# Altium footprint library XTIDA-010086.PcbLib: 88 footprints (part 6 of 6)
Each footprint in its own frame and in the unit in brackets; x right, y up, seen from the top. Pads: shape width x height; smd on the part's side, far side on the other; paste and mask are expansions set on the pad; w line width, h text height; cw(c..) or ccw(c..) is an arc to the next point about the centre after c.
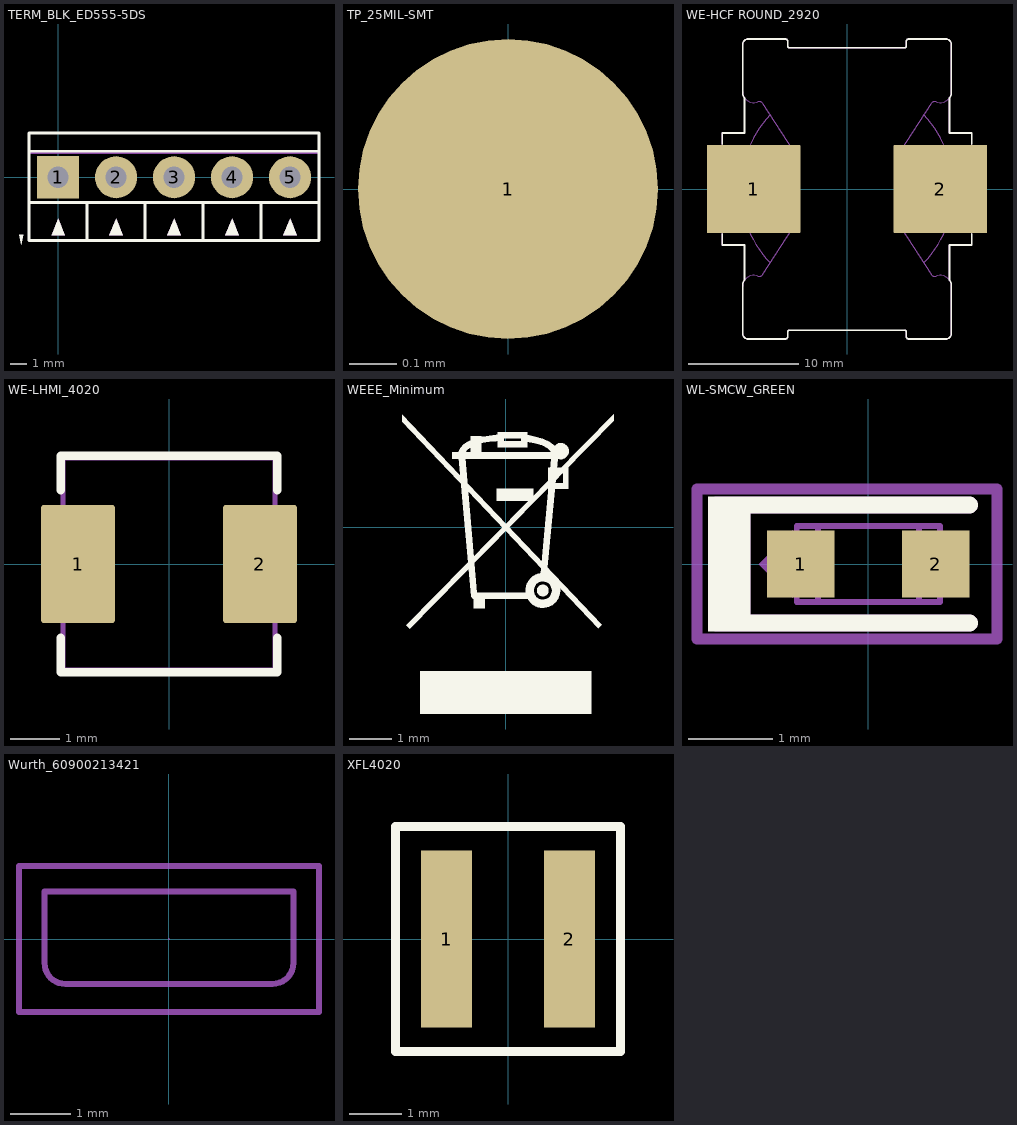
[diagram p5: the footprints below, top view; thin cyan lines are the x and y axes]

## TERM_BLK_ED555-5DS [mm]
height 0.6
pads (5):
  rect 2.54x2.54 hole 1.27: 1(0,0)
  round 2.54 hole 1.27: 2(3.5,0) 3(7,0) 4(10.5,0) 5(14,0)
Top Overlay:
  region: 0.4,-3.5 -0.4,-3.5 0,-2.5
  region: -2.235,-4.089 -2.108,-3.48 -2.362,-3.48
  region: 3.9,-3.5 3.1,-3.5 3.5,-2.5
  region: 10.9,-3.5 10.1,-3.5 10.5,-2.5
  region: 7.4,-3.5 6.6,-3.5 7,-2.5
  region: 14.4,-3.5 13.6,-3.5 14,-2.5
  lines w0.178: -1.752,1.572 1.748,1.572 5.248,1.572 8.748,1.572 12.248,1.572 15.748,1.572 ; 1.75,-3.815 1.75,-1.528 ; 5.25,-3.815 5.25,-1.528 ; 5.25,-3.81 -1.75,-3.81 -1.75,2.667 5.25,2.667 ; 8.75,-3.81 15.75,-3.81 ; 8.75,2.667 15.75,2.667 ; 12.25,-3.815 12.25,-1.528 ; 15.748,-3.828 12.248,-3.828 8.748,-3.828 ; 15.748,-1.528 12.248,-1.528 8.748,-1.528 ; 15.748,2.672 12.248,2.672 8.748,2.672 5.248,2.672 1.748,2.672 -1.752,2.672 -1.752,1.472 -1.752,-1.528 ; 15.75,-3.815 15.75,-1.528 15.75,1.472 15.75,2.672 ; -1.752,-1.528 1.748,-1.528 5.248,-1.528 8.748,-1.528 ; -1.752,-1.528 -1.752,-3.828 1.748,-3.828 5.248,-3.828 8.748,-3.828 ; 8.748,-3.828 8.748,-1.528 ; 8.748,-3.828 8.748,-1.528
Mechanical 5:
  region: 0.4,-3.5 -0.4,-3.5 0,-2.5
  region: 3.9,-3.5 3.1,-3.5 3.5,-2.5
  region: 7.4,-3.5 6.6,-3.5 7,-2.5
  region: 10.9,-3.5 10.1,-3.5 10.5,-2.5
  region: 14.4,-3.5 13.6,-3.5 14,-2.5
  lines w0.127: 1.75,-3.815 1.75,-1.528 ; 5.25,-3.815 5.25,-1.528 ; 5.25,-3.81 -1.75,-3.81 -1.75,2.667 5.25,2.667 ; 8.75,-3.81 15.75,-3.81 ; 8.75,2.667 15.75,2.667 ; 12.25,-3.815 12.25,-1.528 ; 15.748,-3.828 12.248,-3.828 8.748,-3.828 ; 15.748,-1.528 12.248,-1.528 8.748,-1.528 ; 15.748,1.472 12.248,1.472 8.748,1.472 5.248,1.472 1.748,1.472 -1.752,1.472 ; 15.748,2.672 12.248,2.672 8.748,2.672 5.248,2.672 1.748,2.672 -1.752,2.672 -1.752,1.472 ; 15.75,-3.815 15.75,-1.528 15.75,1.472 15.75,2.672 ; -1.752,-1.528 -1.752,1.472 ; -1.752,-1.528 1.748,-1.528 5.248,-1.528 8.748,-1.528 ; -1.752,-1.528 -1.752,-3.828 1.748,-3.828 5.248,-3.828 8.748,-3.828 ; 8.748,-3.828 8.748,-1.528
  text ".Designator" at 2,1.139 h1
3D body "On-Shore_ED555_5DS.stp": height 8.2, standoff -3.5, extent -1.745,-3.8 15.755,2.7

## TP_25MIL-SMT [mm]
height 1.75
pads (1):
  round 0.635 smd mask-0.064: 1(0,0)

## WE-HCF ROUND_2920 [mm] "SMT High Current Inductor, 2-Leads, body 28x25mm"
height 20.5
pads (2):
  rrect1% 8.5x8 smd: 1(-8.5,0) 2(8.5,0)
Top Overlay:
  lines w0.101: -9.5,8.719 ccw(c-8.903,8.719) -9.325,8.297
  lines w0.152: -11.35,-5.1 -10.35,-5.1 ; -11.35,-5.1 -11.35,-4.1 ; -11.35,-5.1 -11.35,-4.1 ; -11.35,-5.1 -10.35,-5.1 ; -11.35,-5.1 -11.35,-4.1 ; -11.35,-5.1 -10.35,-5.1 ; -11.35,4.1 -11.35,5.1 ; -11.35,4.1 -11.35,5.1 ; -11.35,4.1 -11.35,5.1 ; -11.35,5.1 -10.35,5.1 ; -11.35,5.1 -10.35,5.1 ; -11.35,5.1 -10.35,5.1 ; -10.35,-5.1 -9.325,-5.1 ; -10.35,5.1 -9.325,5.1 ; -9.325,-8.297 ccw(c-8.903,-8.719) -9.5,-8.719 -9.5,-8.868 -9.5,-13.15 ccw(c-9,-13.15) -9,-13.65 -5.6,-13.65 ccw(c-5.6,-13.45) -5.4,-13.45 -5.4,-13 cw(c-5.25,-13) -5.25,-12.85 0,-12.85 5.25,-12.85 cw(c5.25,-13) 5.4,-13 5.4,-13.45 ccw(c5.6,-13.45) 5.6,-13.65 9,-13.65 ccw(c9,-13.15) 9.5,-13.15 9.5,-8.868 9.5,-8.719 ccw(c8.903,-8.719) 9.325,-8.297 ; -9.325,-8.297 -9.325,-7.6 ; -9.325,-8.297 -9.325,-7.6 ; -9.325,-8.297 -9.325,-7.6 ; -9.325,-7.6 -9.325,-5.1 ; -9.325,-7.6 -9.325,-5.1 ; -9.325,-7.6 -9.325,-5.1 ; -9.325,5.1 -9.325,7.6 ; -9.325,5.1 -9.325,7.6 ; -9.325,5.1 -9.325,7.6 ; -9.325,7.6 -9.325,8.297 ; -9.325,7.6 -9.325,8.297 ; -9.325,7.6 -9.325,8.297 ; -9.325,8.297 cw(c-8.903,8.719) -9.5,8.719 -9.5,8.868 -9.5,13.15 cw(c-9,13.15) -9,13.65 -5.6,13.65 cw(c-5.6,13.45) -5.4,13.45 -5.4,13 ccw(c-5.25,13) -5.25,12.85 0,12.85 5.25,12.85 ccw(c5.25,13) 5.4,13 5.4,13.45 cw(c5.6,13.45) 5.6,13.65 9,13.65 cw(c9,13.15) 9.5,13.15 9.5,8.868 9.5,8.719 cw(c8.903,8.719) 9.325,8.297 ; 9.325,-8.297 9.325,-7.6 ; 9.325,-8.297 9.325,-7.6 ; 9.325,-8.297 9.325,-7.6 ; 9.325,-7.6 9.325,-5.1 ; 9.325,-7.6 9.325,-5.1 ; 9.325,-7.6 9.325,-5.1 ; 9.325,-5.1 10.35,-5.1 ; 9.325,5.1 9.325,7.6 ; 9.325,5.1 10.35,5.1 ; 9.325,5.1 9.325,7.6 ; 9.325,5.1 9.325,7.6 ; 9.325,7.6 9.325,8.297 ; 9.325,7.6 9.325,8.297 ; 9.325,7.6 9.325,8.297 ; 10.35,-5.1 11.35,-5.1 ; 10.35,-5.1 11.35,-5.1 ; 10.35,-5.1 11.35,-5.1 ; 10.35,5.1 11.35,5.1 ; 10.35,5.1 11.35,5.1 ; 10.35,5.1 11.35,5.1 ; 11.35,-5.1 11.35,-4.1 ; 11.35,-5.1 11.35,-4.1 ; 11.35,-5.1 11.35,-4.1 ; 11.35,4.1 11.35,5.1 ; 11.35,4.1 11.35,5.1 ; 11.35,4.1 11.35,5.1
Mechanical 5:
  lines w0.1: -6.984,-6.731 cw(c0,0) -6.97,6.746 ; 6.97,6.746 cw(c0,0) 6.984,-6.731 ; -11.548,-3 -11.548,0 ; -11.548,-3 -11.35,-3 ; -11.548,-3 -11.548,0 ; -11.548,-3 -11.35,-3 ; -11.548,-3 -11.35,-3 ; -11.548,-3 -11.548,0 ; -11.548,0 -11.548,3 ; -11.548,0 -11.548,3 ; -11.548,0 -11.548,3 ; -11.548,3 -11.35,3 ; -11.548,3 -11.35,3 ; -11.548,3 -11.35,3 ; -11.35,-5.1 -10.35,-5.1 ; -11.35,-5.1 -11.35,-4.1 ; -11.35,-5.1 -10.35,-5.1 ; -11.35,-5.1 -11.35,-4.1 ; -11.35,-5.1 -11.35,-4.1 ; -11.35,-5.1 -10.35,-5.1 ; -11.35,-4.1 -11.35,-2.686 -11.35,0 -11.35,2.686 -11.35,4.1 ; -11.35,4.1 -11.35,5.1 ; -11.35,4.1 -11.35,5.1 ; -11.35,4.1 -11.35,5.1 ; -11.35,5.1 -10.35,5.1 ; -11.35,5.1 -10.35,5.1 ; -11.35,5.1 -10.35,5.1 ; -10.35,-5.1 -9.325,-5.1 ; -10.35,5.1 -9.325,5.1 ; -9.325,-8.297 -9.325,-7.6 ; -9.325,-8.297 -9.325,-7.6 ; -9.325,-8.297 -9.325,-7.6 ; -9.325,-7.6 -9.325,-5.1 ; -9.325,-7.6 -9.325,-5.1 ; -9.325,-7.6 -9.325,-5.1 ; -9.325,5.1 -9.325,7.6 ; -9.325,5.1 -9.325,7.6 ; -9.325,5.1 -9.325,7.6 ; -9.325,7.6 -9.325,8.297 ; -9.325,7.6 -9.325,8.297 ; -9.325,7.6 -9.325,8.297 ; 9.325,-8.297 9.325,-7.6 ; 9.325,-8.297 9.325,-7.6 ; 9.325,-8.297 9.325,-7.6 ; 9.325,-7.6 9.325,-5.1 ; 9.325,-7.6 9.325,-5.1 ; 9.325,-7.6 9.325,-5.1 ; 9.325,-5.1 10.35,-5.1 ; 9.325,5.1 9.325,7.6 ; 9.325,5.1 9.325,7.6 ; 9.325,5.1 10.35,5.1 ; 9.325,5.1 9.325,7.6 ; 9.325,7.6 9.325,8.297 ; 9.325,7.6 9.325,8.297 ; 9.325,7.6 9.325,8.297 ; 10.35,-5.1 11.35,-5.1 ; 10.35,-5.1 11.35,-5.1 ; 10.35,-5.1 11.35,-5.1 ; 10.35,5.1 11.35,5.1 ; 10.35,5.1 11.35,5.1 ; 10.35,5.1 11.35,5.1 ; 11.35,-5.1 11.35,-4.1 ; 11.35,-5.1 11.35,-4.1 ; 11.35,-5.1 11.35,-4.1 ; 11.35,-4.1 11.35,-2.686 11.35,0 11.35,2.686 11.35,4.1 ; 11.35,-3 11.548,-3 ; 11.35,-3 11.548,-3 ; 11.35,-3 11.548,-3 ; 11.35,3 11.548,3 ; 11.35,3 11.548,3 ; 11.35,3 11.548,3 ; 11.35,4.1 11.35,5.1 ; 11.35,4.1 11.35,5.1 ; 11.35,4.1 11.35,5.1 ; 11.548,-3 11.548,0 ; 11.548,-3 11.548,0 ; 11.548,-3 11.548,0 ; 11.548,0 11.548,3 ; 11.548,0 11.548,3 ; 11.548,0 11.548,3 ; -9.5,-13.15 ccw(c-9,-13.15) -9,-13.65 -5.6,-13.65 ccw(c-5.6,-13.45) -5.4,-13.45 -5.4,-13 cw(c-5.25,-13) -5.25,-12.85 0,-12.85 5.25,-12.85 cw(c5.25,-13) 5.4,-13 5.4,-13.45 ccw(c5.6,-13.45) 5.6,-13.65 9,-13.65 ccw(c9,-13.15) 9.5,-13.15 9.5,-8.868 ccw(c8.48,-8.868) 8.1,-7.921 cw(c7.963,-7.578) 7.652,-7.779 4.873,-3.5 ccw(c0,0) 6,0 ccw(c0,0) 4.873,3.5 7.652,7.779 cw(c7.963,7.578) 8.1,7.921 ccw(c8.48,8.868) 9.5,8.868 9.5,13.15 ccw(c9,13.15) 9,13.65 5.6,13.65 ccw(c5.6,13.45) 5.4,13.45 5.4,13 cw(c5.25,13) 5.25,12.85 0,12.85 -5.25,12.85 cw(c-5.25,13) -5.4,13 -5.4,13.45 ccw(c-5.6,13.45) -5.6,13.65 -9,13.65 ccw(c-9,13.15) -9.5,13.15 -9.5,8.868 ccw(c-8.48,8.868) -8.1,7.921 cw(c-7.963,7.578) -7.652,7.779 -4.873,3.5 ccw(c0,0) -6,0 ccw(c0,0) -4.873,-3.5 -7.652,-7.779 cw(c-7.963,-7.578) -8.1,-7.921 ccw(c-8.48,-8.868) -9.5,-8.868 -9.5,-13.15
  text ".Designator" at -4.998,-0.333 h1
3D body "WE-HCF Round_2920.stp": height 20, standoff 0, extent -11.548,-13.65 11.548,13.65

## WE-LHMI_4020 [mm] "WERTH"
height 2
pads (2):
  rrect7% 1.5x2.4 smd: 1(-1.85,0) 2(1.85,0)
Top Overlay:
  lines w0.17: -2.2,-1.5 -2.2,-2.2 2.2,-2.2 2.2,-1.5 ; -2.2,1.5 -2.2,2.2 2.2,2.2 2.2,1.5
Mechanical 5:
  lines w0.1: -2.155,-2.155 -2.155,2.155 2.155,2.155 2.155,-2.155 -2.155,-2.155
  text ".Designator" at -2.999,-0.2 h0.6
Mechanical 13:
  lines w0.1: -2.155,-2.155 -2.155,2.155 2.155,2.155 2.155,-2.155 -2.155,-2.155
3D body: height 2, standoff 0, extent -2.154,-2.154 2.154,2.154

## WEEE_Minimum [mm] "WEEElie bin"
height 19.05
Top Overlay:
  drawing of 23 lines, arcs and shapes, not listed

## WL-SMCW_GREEN [mm] "WURTH"
height 0.8
pads (2):
  rect 0.8x0.8 smd: 1(-0.8,0) 2(0.8,0)
Top Overlay:
  rectangle: -1.9,-0.8 -1.4,0.8
  lines w0.2: -1.6,-0.7 1.2,-0.7 ; -1.6,0.7 1.2,0.7
Mechanical 5:
  region: -0.9,-0.4 -0.9,0.4 -1.3,0
  lines w0.127: -2.032,-0.889 1.524,-0.889 1.524,0.889 -2.032,0.889 -2.032,-0.889
  text ".Designator" at -2.249,-0.15 h0.45
Mechanical 13:
  lines w0.07: -0.6,-0.45 -0.6,0.45 ; 0.6,-0.45 0.6,0.45 ; -0.85,-0.45 0.85,-0.45 0.85,0.45 -0.85,0.45 -0.85,-0.45
  lines w0.2: -1.65,-0.7 -1.65,0.55 ; 1.2,-0.7 -1.5,-0.7 ; 1.2,0.7 -1.5,0.7 ; -1.5,-0.7 -1.8,-0.7 -1.8,0.7 -1.5,0.7 ; -1.5,-0.7 -1.5,0.7
3D body: height 0.8, standoff 0.35, extent -0.599,-0.449 0.599,0.449
3D body: height 0.35, standoff 0, extent 0.601,-0.449 0.849,0.449
3D body: height 0.35, standoff 0, extent -0.599,-0.449 0.599,0.449
3D body: height 0.35, standoff 0, extent -0.849,-0.449 -0.601,0.449

## Wurth_60900213421 [mil] "Shunt, 2.54mm, Black"
height 240.94
pads (1):
  round 1 on Mech3: 0(0,0)
Mechanical 5:
  lines w3.94: -98.42,-48.03 -98.42,48.03 98.43,48.03 98.43,-48.03 -98.42,-48.03 ; -81.69,-15.71 ccw(c-67.89,-15.73) -67.91,-29.53 67.92,-29.53 ccw(c67.9,-15.73) 81.7,-15.71 81.7,31.3 -81.69,31.3 -81.69,-15.71
  text ".Designator" at -89.97,-6 h18
3D body "60900213421.stp": height 235.91, standoff 0.48, extent -98.42,-48.03 98.43,48.04

## XFL4020 [mm] "Coilcraft XFL4020 7/18/12"
height 2.1
pads (2):
  rect 0.98x3.4 smd: 1(-1.181,0) 2(1.181,0)
Top Overlay:
  lines w0.17: -2.159,-2.159 -2.159,2.159 2.159,2.159 2.159,-2.159 -2.159,-2.159
Mechanical 5:
  lines w0.1: -2.146,-2.146 -2.146,2.146 2.146,2.146 2.146,-2.146 -2.146,-2.146
  text ".Designator" at -2.999,-0.2 h0.6
Mechanical 13:
  lines w0.1: -2.146,-2.146 -2.146,2.146 2.146,2.146 2.146,-2.146 -2.146,-2.146
3D body: height 2.1, standoff 0, extent -2.146,-2.146 2.146,2.146
3D body: height 2.1, standoff 2.03, extent 1.398,-1.269 1.65,1.269